# Altium footprint library Connectors.PcbLib: 135 footprints (part 6 of 9)
Each footprint in its own frame and in the unit in brackets; x right, y up, seen from the top. Pads: shape width x height; smd on the part's side, far side on the other; paste and mask are expansions set on the pad; w line width, h text height; cw(c..) or ccw(c..) is an arc to the next point about the centre after c.
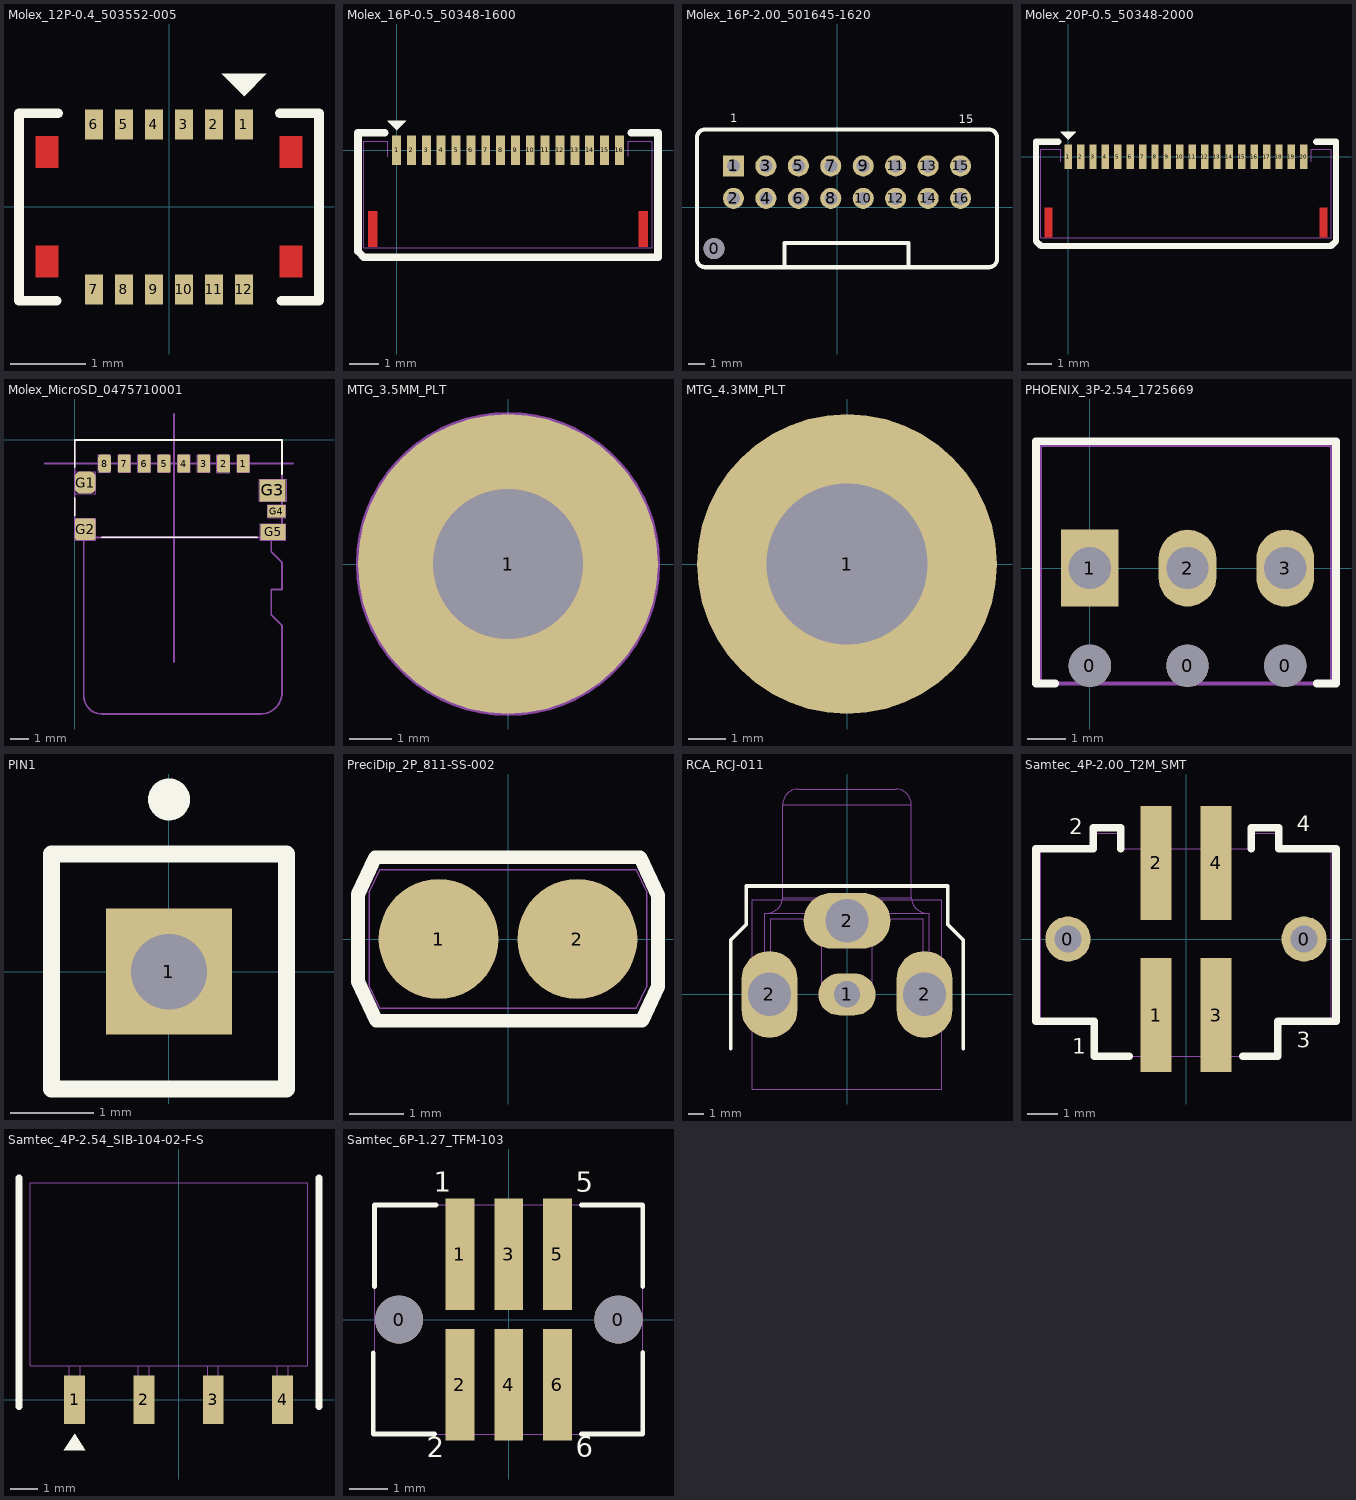
[diagram p5: the footprints below, top view; thin cyan lines are the x and y axes]

## Molex_12P-0.4_503552-005 [mm] "Connector BtB 12pos 0.4mm SMT"
height 0.439
pads (12):
  rect 0.24x0.4 smd: 1(1,1.1) 2(0.6,1.1) 3(0.2,1.1) 4(-0.2,1.1) 5(-0.6,1.1) 6(-1,1.1) 7(-1,-1.1) 8(-0.6,-1.1) 9(-0.2,-1.1) 10(0.2,-1.1) 11(0.6,-1.1) 12(1,-1.1)
Top Layer:
  region: 1.48,0.94 1.78,0.94 1.78,0.52 1.48,0.52
  region: 1.48,-0.94 1.78,-0.94 1.78,-0.52 1.48,-0.52
  region: -1.48,-0.94 -1.78,-0.94 -1.78,-0.52 -1.48,-0.52
  region: -1.48,0.94 -1.78,0.94 -1.78,0.52 -1.48,0.52
Top Overlay:
  region: 0.7,1.775 1.3,1.775 1,1.475
  lines w0.127: -1.5,-1.25 -2,-1.25 -2,1.25 -1.48,1.25 ; 1.48,1.25 2,1.25 2,-1.25 1.5,-1.25
Mechanical 1:
  text ".Designator" at -0.9,-0.35 h1
  text "1" at 0.875,1.45 h0.5
  text "6" at -1.125,1.45 h0.5
  text "7" at -1.175,-2 h0.5
  text "12" at 0.825,-2 h0.5
3D body "5035521220.stp": height 0.56, standoff -0.02, extent -1.93,-1.1 1.93,1.1

## Molex_16P-0.5_50348-1600 [mm] "Connector Header FFC/FPC 16pos 0.5mm RA SMT"
height 1
pads (16):
  rect 0.3x1 smd mask+0.08: 1(0,0) 2(0.5,0) 3(1,0) 4(1.5,0) 5(2,0) 6(2.5,0) 7(3,0) 8(3.5,0) 9(4,0) 10(4.5,0) 11(5,0) 12(5.5,0) 13(6,0) 14(6.5,0) 15(7,0) 16(7.5,0)
Top Layer:
  region: 8.15,-2.05 8.45,-2.05 8.45,-3.25 8.15,-3.25
  region: -0.95,-2.05 -0.65,-2.05 -0.65,-3.25 -0.95,-3.25
Top Overlay:
  region: -0.3,1 0.3,1 0,0.7
  lines w0.025: -0.3,1 0.3,1 0,0.7 -0.3,1
  lines w0.254: -0.4,0.6 -1.3,0.6 -1.3,-3.4 -1.1,-3.6 8.8,-3.6 8.8,-1.8 8.8,0.6 7.9,0.6
Mechanical 1:
  lines w0.025: -0.3,-0.21 -0.3,0.3 -1.1,0.3 -1.1,-3.275 8.6,-3.275 8.6,0.3 7.8,0.3 7.8,-0.2
  text ".Designator" at 1.2,1.2 h1
  text "16" at 6.7,-1.8 h1
  text "1" at -0.2,-1.7 h1
3D body "5034801600.stp": height 1.9, standoff 0, extent -1.1,-3.303 8.6,0.297

## Molex_16P-2.00_501645-1620 [mm] "Connector Header 16pos dual row 2.00mmp through hole"
height 11
pads (17):
  round 1.3 hole 1.3 unplated paste-1.3: 0(-7.6,-2.55)
  rect 1.3x1.3 hole 0.8 paste-1.5: 1(-6.4,2.55)
  round 1.3 hole 0.8 paste-1.5: 2(-6.4,0.55) 3(-4.4,2.55) 4(-4.4,0.55) 5(-2.4,2.55) 6(-2.4,0.55) 7(-0.4,2.55) 8(-0.4,0.55) 9(1.6,2.55) 10(1.6,0.55) 11(3.6,2.55) 12(3.6,0.55) 13(5.6,2.55) 14(5.6,0.55) 15(7.6,2.55) 16(7.6,0.55)
Top Overlay:
  lines w0.254: -3.25,-3.7 -3.25,-2.2 -3.2,-2.2 4.4,-2.2 4.4,-3.7 ; -8.65,-3.2 ccw(c-8.15,-3.2) -8.15,-3.7 9.35,-3.7 ccw(c9.35,-3.2) 9.85,-3.2 9.85,4.3 ccw(c9.35,4.3) 9.35,4.8 -8.15,4.8 ccw(c-8.15,4.3) -8.65,4.3 -8.65,-3.2
  text "1" at -6.6,5.05 h0.9
  text "15" at 7.5,5 h0.9
Mechanical 1:
  circle w0.025: c-6.4,2.55 r0.5
  text "1" at -6.6,3.75 h1
  text ".Designator" at -2,1 h1.52
3D body "5016451620.stp": height 12, standoff -3.2, extent -8.4,-3.55 9.6,4.65

## Molex_20P-0.5_50348-2000 [mm] "Connector Header FFC/FPC 20pos 0.5mm RA SMT"
height 1
pads (20):
  rect 0.3x1 smd mask+0.044: 1(0,0) 2(0.5,0) 3(1,0) 4(1.5,0) 5(2,0) 6(2.5,0) 7(3,0) 8(3.5,0) 9(4,0) 10(4.5,0) 11(5,0) 12(5.5,0) 13(6,0) 14(6.5,0) 15(7,0) 16(7.5,0) 17(8,0) 18(8.5,0) 19(9,0) 20(9.5,0)
Top Layer:
  region: 10.15,-2.05 10.45,-2.05 10.45,-3.25 10.15,-3.25
  region: -0.95,-2.05 -0.65,-2.05 -0.65,-3.25 -0.95,-3.25
Top Overlay:
  region: -0.3,1 0.3,1 0,0.7
  lines w0.025: -0.3,1 0.3,1 0,0.7 -0.3,1
  lines w0.254: -0.4,0.6 -1.3,0.6 -1.3,-3.4 -1.1,-3.6 10.6,-3.6 10.8,-3.4 10.8,0.6 10,0.6
Mechanical 1:
  lines w0.025: -0.3,-0.21 -0.3,0.3 -1.1,0.3 -1.1,-3.275 10.6,-3.275 10.6,0.3 9.8,0.3 9.8,-0.2
  text ".Designator" at 2.6,0.8 h1
  text "20" at 8.8,-1.7 h1
  text "1" at -0.2,-1.7 h1
3D body "5034802000.stp": height 1.9, standoff 0, extent -1.1,-3.3 10.6,0.3

## Molex_MicroSD_0475710001 [mm] "CONN MICRO SD CARD PUSH-PULL R/A"
height 2.311
pads (13):
  rrect20% 0.7x1 smd: 1(9.35,-1.31) 2(8.25,-1.31) 3(7.15,-1.31) 4(6.05,-1.31) 5(4.95,-1.31) 6(3.85,-1.31) 7(2.75,-1.31)
  rrect40% 0.7x1 smd: 8(1.65,-1.31)
  rrect50% 1.15x1.2 smd: G1(0.575,-2.36)
  rrect20% 1.15x1.2 smd: G2(0.575,-4.95)
  rect 1.45x1.2 smd: G3(10.975,-2.8)
  rect 1x0.7 smd: G4(11.2,-3.95)
  rect 1.4x0.9 smd: G5(11,-5.1)
Top Overlay:
  lines w0.1: 0,-4.2 0,-3.2 ; 0,-1.5 0,0 11.5,0 11.5,-1.9 ; 1.5,-5.4 10.1,-5.4
Mechanical 1:
  lines w0.025: 0,-5.563 1.168,-5.563 1.168,-4.343 0,-4.343 0,-5.563 ; 0,-2.972 0,-1.753 1.168,-1.753 1.168,-2.972 0,-2.972 ; 1.3,-1.803 2.007,-1.803 2.007,-0.813 1.3,-0.813 1.3,-1.803 ; 2.4,-1.803 2.4,-0.813 3.107,-0.813 3.107,-1.803 2.4,-1.803 ; 3.5,-1.803 3.5,-0.813 4.207,-0.813 4.207,-1.803 3.5,-1.803 ; 4.6,-1.803 4.6,-0.813 5.307,-0.813 5.307,-1.803 4.6,-1.803 ; 5.7,-1.803 5.7,-0.813 6.407,-0.813 6.407,-1.803 5.7,-1.803 ; 6.8,-1.803 6.8,-0.813 7.507,-0.813 7.507,-1.803 6.8,-1.803 ; 7.88,-1.814 7.88,-0.824 8.586,-0.824 8.586,-1.814 7.88,-1.814 ; 9,-1.803 9,-0.813 9.707,-0.813 9.707,-1.803 9,-1.803 ; 10.236,-3.404 11.76,-3.404 11.76,-2.184 10.236,-2.184 10.236,-3.404 ; 10.287,-5.563 11.709,-5.563 11.709,-4.648 10.287,-4.648 10.287,-5.563 ; 10.693,-4.318 11.709,-4.318 11.709,-3.607 10.693,-3.607 10.693,-4.318
  lines w0.1: 0,-4.2 0,-3.1 0,-1.6 0,0 ; 0,0 0,-5.41 1.29,-5.41 10.09,-5.41 11.5,-5.41 11.5,0 5.5,0 0,0
  text ".Designator" at 3.607,-3.429 h1.02
  text "1" at 10.109,-1.676 h1.14
  text "8" at 0.203,-1.676 h1.14
Mechanical 3:
  lines w0.1: -1.65,-1.31 12.1,-1.31 ; 0.5,-5.4 0.5,-14.2 ccw(c1.5,-14.2) 1.5,-15.2 10.3,-15.2 ccw(c10.3,-14) 11.5,-14 11.5,-10.3 10.9,-9.7 10.9,-8.3 11.5,-8.3 11.5,-6.8 10.9,-6.2 10.9,-5.4 ; 5.5,-12.31 5.5,1.44
3D body "475710001.stp": height 2.3, standoff 0, extent 0.12,-5.5 11.52,-0.05

## MTG_3.5MM_PLT [mm] "Mounting Hole 3.5mm Plated"
pads (1):
  round 7 hole 3.5 paste-7: 1(0,0)
Mechanical 1:
  circle w0.1: c0,0 r3.5

## MTG_4.3MM_PLT [mm] "Mounting Hole 4.3mm Plated"
pads (1):
  round 8 hole 4.3 paste-7: 1(0,0)

## PCBComponent_1 [mm]

## PCBComponent_1 - duplicate [mm]

## PHOENIX_3P-2.54_1725669 [mm] "Connector, Terminal Block, 3 Position"
pads (6):
  round 1.1 hole 1.1 unplated paste-1.1: 0(0,-2.54) 0(2.54,-2.54) 0(5.08,-2.54)
  rect 1.5x2 hole 1.1: 1(0,0)
  oval 1.5x2 hole 1.1: 2(2.54,0) 3(5.08,0)
Top Overlay:
  lines w0.2: -0.9,-3 -1.4,-3 -1.4,3.3 6.4,3.3 6.4,-3 5.9,-3
Mechanical 1:
  circle w0.025: c5.08,0 r0.3
  circle w0.025: c2.54,0 r0.3
  circle w0.025: c0,0 r0.3
  circle w0.025: c5.08,-2.54 r0.3
  circle w0.025: c2.54,-2.54 r0.3
  circle w0.025: c0,-2.54 r0.3
  lines w0.1: -1.3,-3 6.3,-3 6.3,3.2 -1.3,3.2 -1.3,-3
  text "3" at 4.2,1.4 h1
  text "2" at 1.64,1.4 h1
  text ".Designator" at 0.1,3.7 h1.52
  text "1" at -0.9,1.4 h1
3D body "PhoenixContact_1725669.step": height 8.64, standoff -1.91, extent -1.289,-2.99 6.268,3.233

## PIN1 [mm] "Connector; Plug"
pads (1):
  rect 1.5x1.5 hole 0.9: 1(0,0)
Top Overlay:
  circle w0.25: c0,2.05 r0.125
  lines w0.2: -1.4,-1.4 -1.4,1.4 1.4,1.4 1.4,-1.4 -1.4,-1.4

## PreciDip_2P_811-SS-002 [mm] "Connector Spring Loaded 2pos 2.54mmp"
pads (2):
  round 2.2 smd: 1(-1.27,0) 2(1.27,0)
Top Overlay:
  lines w0.254: -2.75,-0.78 -2.75,0.82 -2.433,1.5 2.423,1.5 2.75,0.799 2.75,-0.87 2.456,-1.5 -2.414,-1.5 -2.75,-0.78
Mechanical 1:
  circle w0.025: c-1.27,0 r0.658
  circle w0.025: c1.27,0 r0.658
  lines w0.025: -2.54,-0.87 -2.354,-1.27 2.353,-1.27 2.54,-0.87 2.54,0.87 2.353,1.27 -2.354,1.27 -2.54,0.87 -2.54,-0.87
  text ".Designator" at -0.6,1.6 h1
3D body "Preci-Dip_811-ss-002-30-002101.stp": height 5, standoff 0, extent -2.54,-1.27 2.54,1.27

## RCA_RCJ-011 [mm] "RCA Phono Jack 3.2mm x 9.0mm"
pads (4):
  oval 3.7x2.7 hole 1.7: 1(0,0)
  oval 3.6x5.6 hole 2.8: 2(-5,0) 2(5,0)
  oval 5.6x3.6 hole 2.8: 2(0,4.754)
Top Overlay:
  lines w0.254: -7.5,-3.5 -7.5,3.5 -6.5,4.5 -6.5,7 6.5,7 6.5,4.5 7.5,3.5 7.5,-3.5
Mechanical 1:
  drawing of 434 lines, arcs and shapes, not listed
  text ".Designator" at -3.5,-4.5 h1.52
Mechanical 15:
  lines w0.05: -6.1,-6.1 -6.1,6.1 6.1,6.1 6.1,-6.1 -6.1,-6.1
  lines w0.1: -0.5,0 0.5,0 ; 0,-0.5 0,0.5
3D body "rcj-011.stp": height 12, standoff -4.2, extent -5.8,-1.31 5.8,13.19

## Samtec_4P-2.00_T2M_SMT [mm] "Connector Header 4pos dual row 2.0mmp SMT"
height 4.572
pads (6):
  round 1.5 hole 0.9: 0(-3.935,0) 0(3.935,0)
  rect 1.02x3.8 smd: 1(-1,-2.535) 2(-1,2.535) 3(1,-2.535) 4(1,2.535)
Top Overlay:
  lines w0.25: -2.177,3.015 -2.177,3.7 -3.1,3.7 -3.1,3.015 -5,3.015 -5,-2.735 -3.065,-2.735 -3.065,-3.915 -1.9,-3.915 ; 1.9,-3.915 3.064,-3.915 3.064,-2.735 5,-2.735 5,3.015 3.1,3.015 3.1,3.7 2.177,3.7 2.177,3.015
  text "1" at -3.8,-4 h0.9
  text "3" at 3.69,-3.8 h0.9
  text "4" at 3.69,3.4 h0.9
  text "2" at -3.9,3.3 h0.9
Mechanical 1:
  lines w0.025: -4.837,-2.735 -3.065,-2.735 -3.065,-3.915 3.064,-3.915 3.064,-2.735 4.837,-2.735 4.837,3.015 3.066,3.015 3.066,3.523 2.177,3.523 2.177,3.015 -2.177,3.015 -2.177,3.523 -3.066,3.523 -3.066,3.015 -4.837,3.015 -4.837,-2.735 ; -1.3,-4.2 -1.3,-0.9 -0.7,-0.9 -0.7,-4.2 -1.3,-4.2 ; -1.3,0.87 -0.7,0.87 -0.7,4.17 -1.3,4.17 -1.3,0.87 ; 0.7,-4.2 1.3,-4.2 1.3,-0.9 0.7,-0.9 0.7,-4.2 ; 0.7,0.87 1.3,0.87 1.3,4.17 0.7,4.17 0.7,0.87
  text "2" at -2.2,2.1 h1
  text "4" at 1.89,2.2 h1
  text "3" at 1.99,-2.8 h1
  text "1" at -2.2,-2.8 h1
  text ".Designator" at -1.27,-0.381 h1
3D body "Samtec-T2M-102-01-L-D-SM-WT.stp": height 6.55, standoff -1.65, extent -4.837,-4.314 4.837,4.314

## Samtec_4P-2.54_SIB-104-02-F-S [mil] "Connector Spring  4pos 2.54mmp SMT"
height 208.66
pads (4):
  rect 30x70 smd: 1(-150,0) 2(-50,0) 3(50,0) 4(150,0)
Top Overlay:
  region: -165.75,-72.68 -134.25,-72.68 -150,-49.06
  lines w10: -230,-10 -230,320 ; 202.4,-10 202.4,320
Mechanical 1:
  lines w1: -213.79,49 186.2,49 186.2,313 -213.8,313 -213.79,49 ; -157.5,-22 -142,-22 -142,49 -157.5,49 -157.5,-22 ; -58,-22.01 -58,49 -42.5,49 -42.5,-22 -58,-22 ; 42,-22.01 42,49 57.5,49 57.5,-22 42,-22 ; 142.5,-22 142.5,49 158,49 158,-22 142.5,-22
  text ".Designator" at -40,170 h60
  text "1" at -190,-10 h39.37
  text "4" at 100,-10 h39.37
3D body "Samtec-SIB-104-02-F-S.step": height 206, standoff 0, extent -213.79,-21.99 186.21,313.01

## Samtec_6P-1.27_TFM-103 [mm] "Connector Header 6pos dual row 1.27mmp surface mount"
height 4.572
pads (8):
  round 1.25 hole 1.25 unplated paste-1.25: 0(-2.857,0) 0(2.857,0)
  rect 0.75x2.9 smd: 1(-1.27,1.7) 2(-1.27,-1.7) 3(0,1.7) 4(0,-1.7) 5(1.27,1.7) 6(1.27,-1.7)
Top Overlay:
  lines w0.127: -3.53,-0.864 -3.53,-2.985 -1.93,-2.985 ; -3.492,0.864 -3.492,2.985 -1.892,2.985 ; 1.893,-2.984 3.493,-2.984 3.493,-0.863 ; 1.893,2.985 3.493,2.985 3.493,0.864
  text "1" at -1.947,3.152 h0.9
  text "5" at 1.74,3.143 h0.9
  text "6" at 1.74,-3.751 h0.9
  text "2" at -2.13,-3.764 h0.9
Mechanical 1:
  circle w0.025: c2.857,0 r0.371
  circle w0.025: c-2.857,0 r0.371
  lines w0.025: -3.492,-2.984 -3.492,2.985 3.493,2.985 3.493,-2.984 -3.492,-2.984
  text "2" at -2.148,-3.788 h1
  text "6" at 1.74,-3.751 h1
  text "5" at 1.74,3.143 h1
  text "1" at -1.947,3.152 h1
  text ".Designator" at -1.2,-0.3 h1.52
3D body "Samtec-TFM-103-02-L-D-LC.stp": height 5.59, standoff -1.27, extent -3.492,-2.984 3.493,2.985